# Altium footprint library CONN_B2B.PcbLib: 27 footprints (part 2 of 3)
Each footprint in its own frame and in the unit in brackets; x right, y up, seen from the top. Pads: shape width x height; smd on the part's side, far side on the other; paste and mask are expansions set on the pad; w line width, h text height; cw(c..) or ccw(c..) is an arc to the next point about the centre after c.
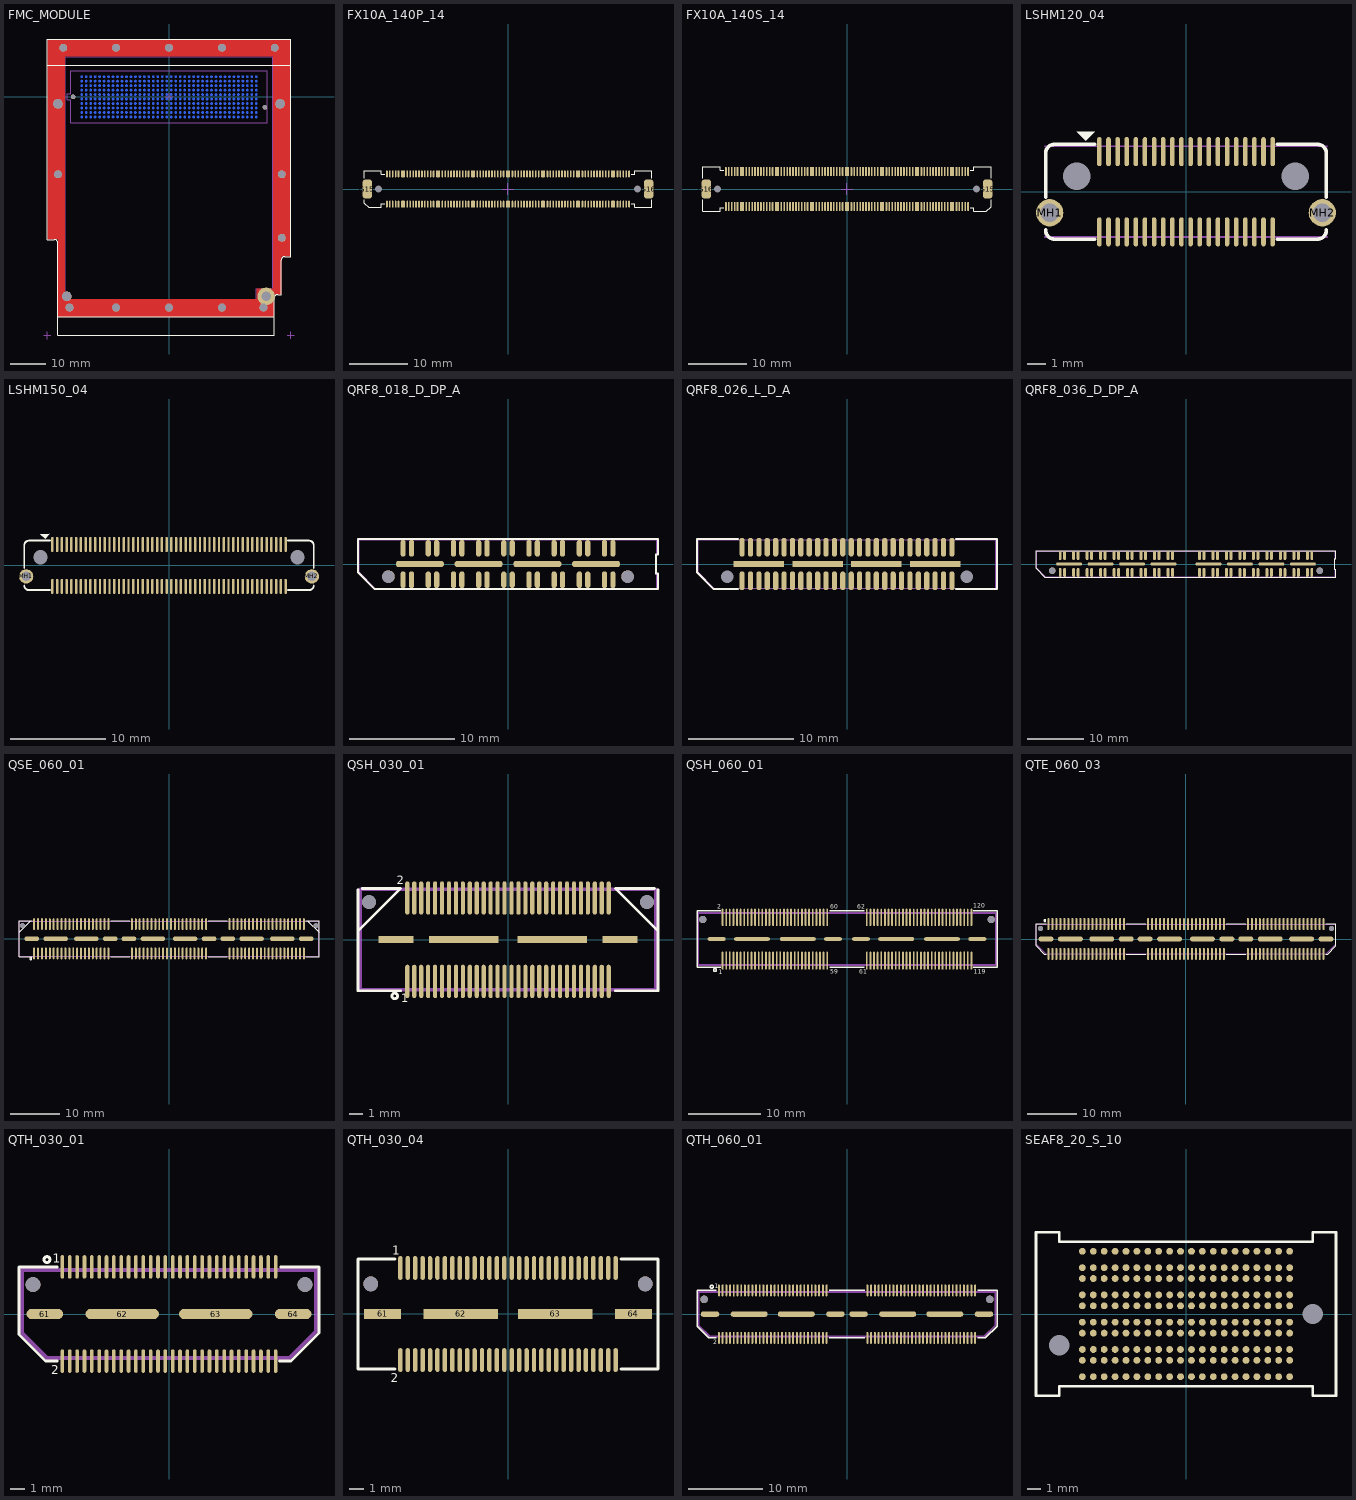
[diagram p1: the footprints below, top view; thin cyan lines are the x and y axes]

## FMC_MODULE [mm] "ASP-134488"
height 1.2
pads (419):
  round 0.65 smd far side: A1(-24.765,5.715) A2(-23.495,5.715) A3(-22.225,5.715) A4(-20.955,5.715) A5(-19.685,5.715) A6(-18.415,5.715) A7(-17.145,5.715) A8(-15.875,5.715) A9(-14.605,5.715) A10(-13.335,5.715) A11(-12.065,5.715) A12(-10.795,5.715) A13(-9.525,5.715) A14(-8.255,5.715) A15(-6.985,5.715) A16(-5.715,5.715) A17(-4.445,5.715) A18(-3.175,5.715) A19(-1.905,5.715) A20(-0.635,5.715) A21(0.635,5.715) A22(1.905,5.715) A23(3.175,5.715) A24(4.445,5.715) A25(5.715,5.715) A26(6.985,5.715) A27(8.255,5.715) A28(9.525,5.715) A29(10.795,5.715) A30(12.065,5.715) A31(13.335,5.715) A32(14.605,5.715) A33(15.875,5.715) A34(17.145,5.715) A35(18.415,5.715) A36(19.685,5.715) A37(20.955,5.715) A38(22.225,5.715) A39(23.495,5.715) A40(24.765,5.715) B1(-24.765,4.445) B2(-23.495,4.445) B3(-22.225,4.445) B4(-20.955,4.445) B5(-19.685,4.445) B6(-18.415,4.445) B7(-17.145,4.445) B8(-15.875,4.445) B9(-14.605,4.445) B10(-13.335,4.445) B11(-12.065,4.445) B12(-10.795,4.445) B13(-9.525,4.445) B14(-8.255,4.445) B15(-6.985,4.445) B16(-5.715,4.445) B17(-4.445,4.445) B18(-3.175,4.445) B19(-1.905,4.445) B20(-0.635,4.445) B21(0.635,4.445) B22(1.905,4.445) B23(3.175,4.445) B24(4.445,4.445) B25(5.715,4.445) B26(6.985,4.445) B27(8.255,4.445) B28(9.525,4.445) B29(10.795,4.445) B30(12.065,4.445) B31(13.335,4.445) B32(14.605,4.445) B33(15.875,4.445) B34(17.145,4.445) B35(18.415,4.445) B36(19.685,4.445) B37(20.955,4.445) B38(22.225,4.445) B39(23.495,4.445) B40(24.765,4.445) C1(-24.765,3.175) C2(-23.495,3.175) C3(-22.225,3.175) C4(-20.955,3.175) C5(-19.685,3.175) C6(-18.415,3.175) C7(-17.145,3.175) C8(-15.875,3.175) C9(-14.605,3.175) C10(-13.335,3.175) C11(-12.065,3.175) C12(-10.795,3.175) C13(-9.525,3.175) C14(-8.255,3.175) C15(-6.985,3.175) C16(-5.715,3.175) C17(-4.445,3.175) C18(-3.175,3.175) C19(-1.905,3.175) C20(-0.635,3.175) C21(0.635,3.175) C22(1.905,3.175) C23(3.175,3.175) C24(4.445,3.175) C25(5.715,3.175) C26(6.985,3.175) C27(8.255,3.175) C28(9.525,3.175) C29(10.795,3.175) C30(12.065,3.175) C31(13.335,3.175) C32(14.605,3.175) C33(15.875,3.175) C34(17.145,3.175) C35(18.415,3.175) C36(19.685,3.175) C37(20.955,3.175) C38(22.225,3.175) C39(23.495,3.175) C40(24.765,3.175) D1(-24.765,1.905) D2(-23.495,1.905) D3(-22.225,1.905) D4(-20.955,1.905) D5(-19.685,1.905) D6(-18.415,1.905) D7(-17.145,1.905) D8(-15.875,1.905) D9(-14.605,1.905) D10(-13.335,1.905) D11(-12.065,1.905) D12(-10.795,1.905) D13(-9.525,1.905) D14(-8.255,1.905) D15(-6.985,1.905) D16(-5.715,1.905) D17(-4.445,1.905) D18(-3.175,1.905) D19(-1.905,1.905) D20(-0.635,1.905) D21(0.635,1.905) D22(1.905,1.905) D23(3.175,1.905) D24(4.445,1.905) D25(5.715,1.905) D26(6.985,1.905) D27(8.255,1.905) D28(9.525,1.905) D29(10.795,1.905) D30(12.065,1.905) D31(13.335,1.905) D32(14.605,1.905) D33(15.875,1.905) D34(17.145,1.905) D35(18.415,1.905) D36(19.685,1.905) D37(20.955,1.905) D38(22.225,1.905) D39(23.495,1.905) D40(24.765,1.905) E1(-24.765,0.635) E2(-23.495,0.635) E3(-22.225,0.635) E4(-20.955,0.635) E5(-19.685,0.635) E6(-18.415,0.635) E7(-17.145,0.635) E8(-15.875,0.635) E9(-14.605,0.635) E10(-13.335,0.635) E11(-12.065,0.635) E12(-10.795,0.635) E13(-9.525,0.635) E14(-8.255,0.635) E15(-6.985,0.635) E16(-5.715,0.635) E17(-4.445,0.635) E18(-3.175,0.635) E19(-1.905,0.635) E20(-0.635,0.635) E21(0.635,0.635) E22(1.905,0.635) E23(3.175,0.635) E24(4.445,0.635) E25(5.715,0.635) E26(6.985,0.635) E27(8.255,0.635) E28(9.525,0.635) E29(10.795,0.635) E30(12.065,0.635) E31(13.335,0.635) E32(14.605,0.635) E33(15.875,0.635) E34(17.145,0.635) E35(18.415,0.635) E36(19.685,0.635) E37(20.955,0.635) E38(22.225,0.635) E39(23.495,0.635) E40(24.765,0.635) F1(-24.765,-0.635) F2(-23.495,-0.635) F3(-22.225,-0.635) F4(-20.955,-0.635) F5(-19.685,-0.635) F6(-18.415,-0.635) F7(-17.145,-0.635) F8(-15.875,-0.635) F9(-14.605,-0.635) F10(-13.335,-0.635) F11(-12.065,-0.635) F12(-10.795,-0.635) F13(-9.525,-0.635) F14(-8.255,-0.635) F15(-6.985,-0.635) F16(-5.715,-0.635) F17(-4.445,-0.635) F18(-3.175,-0.635) F19(-1.905,-0.635) F20(-0.635,-0.635) F21(0.635,-0.635) F22(1.905,-0.635) F23(3.175,-0.635) F24(4.445,-0.635) F25(5.715,-0.635) F26(6.985,-0.635) F27(8.255,-0.635) F28(9.525,-0.635) F29(10.795,-0.635) F30(12.065,-0.635) F31(13.335,-0.635) F32(14.605,-0.635) F33(15.875,-0.635) F34(17.145,-0.635) F35(18.415,-0.635) F36(19.685,-0.635) F37(20.955,-0.635) F38(22.225,-0.635) F39(23.495,-0.635) F40(24.765,-0.635) G1(-24.765,-1.905) G2(-23.495,-1.905) G3(-22.225,-1.905) G4(-20.955,-1.905) G5(-19.685,-1.905) G6(-18.415,-1.905) G7(-17.145,-1.905) G8(-15.875,-1.905) G9(-14.605,-1.905) G10(-13.335,-1.905) G11(-12.065,-1.905) G12(-10.795,-1.905) G13(-9.525,-1.905) G14(-8.255,-1.905) G15(-6.985,-1.905) G16(-5.715,-1.905) G17(-4.445,-1.905) G18(-3.175,-1.905) G19(-1.905,-1.905) G20(-0.635,-1.905) G21(0.635,-1.905) G22(1.905,-1.905) G23(3.175,-1.905) G24(4.445,-1.905) G25(5.715,-1.905) G26(6.985,-1.905) G27(8.255,-1.905) G28(9.525,-1.905) G29(10.795,-1.905) G30(12.065,-1.905) G31(13.335,-1.905) G32(14.605,-1.905) G33(15.875,-1.905) G34(17.145,-1.905) G35(18.415,-1.905) G36(19.685,-1.905) G37(20.955,-1.905) G38(22.225,-1.905) G39(23.495,-1.905) G40(24.765,-1.905) H1(-24.765,-3.175) H2(-23.495,-3.175) H3(-22.225,-3.175) H4(-20.955,-3.175) H5(-19.685,-3.175) H6(-18.415,-3.175) H7(-17.145,-3.175) H8(-15.875,-3.175) H9(-14.605,-3.175) H10(-13.335,-3.175) H11(-12.065,-3.175) H12(-10.795,-3.175) H13(-9.525,-3.175) H14(-8.255,-3.175) H15(-6.985,-3.175) H16(-5.715,-3.175) H17(-4.445,-3.175) H18(-3.175,-3.175) H19(-1.905,-3.175) H20(-0.635,-3.175) H21(0.635,-3.175) H22(1.905,-3.175) H23(3.175,-3.175) H24(4.445,-3.175) H25(5.715,-3.175) H26(6.985,-3.175) H27(8.255,-3.175) H28(9.525,-3.175) H29(10.795,-3.175) H30(12.065,-3.175) H31(13.335,-3.175) H32(14.605,-3.175) H33(15.875,-3.175) H34(17.145,-3.175) H35(18.415,-3.175) H36(19.685,-3.175) H37(20.955,-3.175) H38(22.225,-3.175) H39(23.495,-3.175) H40(24.765,-3.175) J1(-24.765,-4.445) J2(-23.495,-4.445) J3(-22.225,-4.445) J4(-20.955,-4.445) J5(-19.685,-4.445) J6(-18.415,-4.445) J7(-17.145,-4.445) J8(-15.875,-4.445) J9(-14.605,-4.445) J10(-13.335,-4.445) J11(-12.065,-4.445) J12(-10.795,-4.445) J13(-9.525,-4.445) J14(-8.255,-4.445) J15(-6.985,-4.445) J16(-5.715,-4.445) J17(-4.445,-4.445) J18(-3.175,-4.445) J19(-1.905,-4.445) J20(-0.635,-4.445) J21(0.635,-4.445) J22(1.905,-4.445) J23(3.175,-4.445) J24(4.445,-4.445) J25(5.715,-4.445) J26(6.985,-4.445) J27(8.255,-4.445) J28(9.525,-4.445) J29(10.795,-4.445) J30(12.065,-4.445) J31(13.335,-4.445) J32(14.605,-4.445) J33(15.875,-4.445) J34(17.145,-4.445) J35(18.415,-4.445) J36(19.685,-4.445) J37(20.955,-4.445) J38(22.225,-4.445) J39(23.495,-4.445) J40(24.765,-4.445) K1(-24.765,-5.715) K2(-23.495,-5.715) K3(-22.225,-5.715) K4(-20.955,-5.715) K5(-19.685,-5.715) K6(-18.415,-5.715) K7(-17.145,-5.715) K8(-15.875,-5.715) K9(-14.605,-5.715) K10(-13.335,-5.715) K11(-12.065,-5.715) K12(-10.795,-5.715) K13(-9.525,-5.715) K14(-8.255,-5.715) K15(-6.985,-5.715) K16(-5.715,-5.715) K17(-4.445,-5.715) K18(-3.175,-5.715) K19(-1.905,-5.715) K20(-0.635,-5.715) K21(0.635,-5.715) K22(1.905,-5.715) K23(3.175,-5.715) K24(4.445,-5.715) K25(5.715,-5.715) K26(6.985,-5.715) K27(8.255,-5.715) K28(9.525,-5.715) K29(10.795,-5.715) K30(12.065,-5.715) K31(13.335,-5.715) K32(14.605,-5.715) K33(15.875,-5.715) K34(17.145,-5.715) K35(18.415,-5.715) K36(19.685,-5.715) K37(20.955,-5.715) K38(22.225,-5.715) K39(23.495,-5.715) K40(24.765,-5.715)
  round 2.2 hole 2.2: ""(-31.5,-22) ""(-30,13.9) ""(-28.2,-59.8) ""(-15,-59.8) ""(-15,13.9) ""(0,-59.8) ""(0,13.9) ""(15,-59.8) ""(15,13.9) ""(26.8,-59.8) ""(30,13.9) ""(32,-40) ""(32,-22)
  round 2.7 hole 2.7: ""(-31.5,-2) ""(-29,-56.6) ""(31.5,-2)
  round 1.3 hole 1.3 unplated: ""(-27.2,0) ""(27.2,-3)
  round 5 hole 2.7: ""(27.55,-56.6)
Top Layer:
  rectangle: -34.5,11.4 34.5,16.4
  rectangle: -34.5,-40.5 -29.5,16.4
  rectangle: -31.5,-62.4 -29.5,-40.5
  rectangle: -31.5,-62.4 29.8,-57.4
  rectangle: 24.8,-62.4 29.8,-54.4
  rectangle: 29.5,-56.1 31.9,-45.3
  rectangle: 29.5,-45.3 34.5,16.4
Top Overlay:
  lines w0.2: -31.5,-62.4 29.8,-62.4 ; -34.5,8.9 -34.5,-40.5 -32.5,-40.5 cw(c-32.5,-41.5) -31.5,-41.5 -31.5,-67.7 29.8,-67.7 29.8,-57.1 cw(c30.8,-57.1) 30.8,-56.1 31.9,-56.1 31.9,-46.3 cw(c32.9,-46.3) 32.9,-45.3 34.5,-45.3 34.5,8.9 ; -34.5,8.9 34.5,8.9 ; -34.5,8.9 -34.5,16.4 34.5,16.4 34.5,8.9
Bottom Overlay:
  lines w0.2: -29,-6.7 -34,-6.7 -34,16.2 34,16.2 34,-6.7 29,-6.7 ; -28.9,-0.9 -28.9,0.9 -28,0.9 -28,7.5 28,7.5 28,-7.5 -28,-7.5 -28,-0.9 -28.9,-0.9
  text "K" at 29.3,-6.2 h0.8
  text "J" at 29.3,-5 h0.8
  text "E" at 29.3,0.2 h0.8
  text "D" at 29.3,1.5 h0.8
  text "C" at 29.3,2.7 h0.8
  text "B" at 29.3,3.9 h0.8
  text "A" at 29.3,5.2 h0.8
  text "40" at 25.3,8 h0.8
  text "1" at -24.6,8 h0.8
Mechanical 1:
  lines w0.2: -35.5,-67.7 -33.5,-67.7 ; -34.5,-68.7 -34.5,-66.7 ; -1,0 1,0 ; 0,-1 0,1 ; 24.8,-57.4 -29.5,-57.4 -29.5,11.4 29.5,11.4 29.5,-54.4 24.8,-54.4 24.8,-57.3 ; 33.5,-67.7 35.5,-67.7 ; 34.5,-68.7 34.5,-66.7
Mechanical 13:
  lines w0.2: -28.8,-0.8 -27.9,-0.8 -27.9,-7.4 27.9,-7.4 27.9,7.4 -27.9,7.4 -27.9,0.8 -28.8,0.8 -28.8,-0.8
3D body "SEAM-40-02.0-L-10-1-A-K-TR.stp": height 5.66, standoff -1.22, extent -28.778,-7.341 27.889,7.341

## FX10A_140P_14 [mm] "FX10A-140P/14-SV(71) HIROSE"
height 4
pads (158):
  oval 0.3x1.2 smd mask+0.075: 1(-20.75,-2.6) 2(-20.75,2.6) 3(-20.25,-2.6) 4(-20.25,2.6) 5(-19.75,-2.6) 6(-19.75,2.6) 7(-19.25,-2.6) 8(-19.25,2.6) 9(-18.75,-2.6) 10(-18.75,2.6) 11(-17.25,-2.6) 12(-17.25,2.6) 13(-16.75,-2.6) 14(-16.75,2.6) 15(-16.25,-2.6) 16(-16.25,2.6) 17(-15.75,-2.6) 18(-15.75,2.6) 19(-15.25,-2.6) 20(-15.25,2.6) 21(-14.75,-2.6) 22(-14.75,2.6) 23(-14.25,-2.6) 24(-14.25,2.6) 25(-13.75,-2.6) 26(-13.75,2.6) 27(-13.25,-2.6) 28(-13.25,2.6) 29(-12.75,-2.6) 30(-12.75,2.6) 31(-11.25,-2.6) 32(-11.25,2.6) 33(-10.75,-2.6) 34(-10.75,2.6) 35(-10.25,-2.6) 36(-10.25,2.6) 37(-9.75,-2.6) 38(-9.75,2.6) 39(-9.25,-2.6) 40(-9.25,2.6) 41(-8.75,-2.6) 42(-8.75,2.6) 43(-8.25,-2.6) 44(-8.25,2.6) 45(-7.75,-2.6) 46(-7.75,2.6) 47(-7.25,-2.6) 48(-7.25,2.6) 49(-6.75,-2.6) 50(-6.75,2.6) 51(-5.25,-2.6) 52(-5.25,2.6) 53(-4.75,-2.6) 54(-4.75,2.6) 55(-4.25,-2.6) 56(-4.25,2.6) 57(-3.75,-2.6) 58(-3.75,2.6) 59(-3.25,-2.6) 60(-3.25,2.6) 61(-2.75,-2.6) 62(-2.75,2.6) 63(-2.25,-2.6) 64(-2.25,2.6) 65(-1.75,-2.6) 66(-1.75,2.6) 67(-1.25,-2.6) 68(-1.25,2.6) 69(-0.75,-2.6) 70(-0.75,2.6) 71(0.75,-2.6) 72(0.75,2.6) 73(1.25,-2.6) 74(1.25,2.6) 75(1.75,-2.6) 76(1.75,2.6) 77(2.25,-2.6) 78(2.25,2.6) 79(2.75,-2.6) 80(2.75,2.6) 81(3.25,-2.6) 82(3.25,2.6) 83(3.75,-2.6) 84(3.75,2.6) 85(4.25,-2.6) 86(4.25,2.6) 87(4.75,-2.6) 88(4.75,2.6) 89(5.25,-2.6) 90(5.25,2.6) 91(6.75,-2.6) 92(6.75,2.6) 93(7.25,-2.6) 94(7.25,2.6) 95(7.75,-2.6) 96(7.75,2.6) 97(8.25,-2.6) 98(8.25,2.6) 99(8.75,-2.6) 100(8.75,2.6) 101(9.25,-2.6) 102(9.25,2.6) 103(9.75,-2.6) 104(9.75,2.6) 105(10.25,-2.6) 106(10.25,2.6) 107(10.75,-2.6) 108(10.75,2.6) 109(11.25,-2.6) 110(11.25,2.6) 111(12.75,-2.6) 112(12.75,2.6) 113(13.25,-2.6) 114(13.25,2.6) 115(13.75,-2.6) 116(13.75,2.6) 117(14.25,-2.6) 118(14.25,2.6) 119(14.75,-2.6) 120(14.75,2.6) 121(15.25,-2.6) 122(15.25,2.6) 123(15.75,-2.6) 124(15.75,2.6) 125(16.25,-2.6) 126(16.25,2.6) 127(16.75,-2.6) 128(16.75,2.6) 129(17.25,-2.6) 130(17.25,2.6) 131(18.75,-2.6) 132(18.75,2.6) 133(19.25,-2.6) 134(19.25,2.6) 135(19.75,-2.6) 136(19.75,2.6) 137(20.25,-2.6) 138(20.25,2.6) 139(20.75,-2.6) 140(20.75,2.6)
  rrect50% 0.7x1.2 smd mask+0.075: G1(-18,-2.6) G2(-18,2.6) G3(-12,-2.6) G4(-12,2.6) G5(-6,-2.6) G6(-6,2.6) G7(0,-2.6) G8(0,2.6) G9(6,-2.6) G10(6,2.6) G11(12,-2.6) G12(12,2.6) G13(18,-2.6) G14(18,2.6)
  rrect50% 1.6x3.2 smd mask+0.075: G15(-24.1,0) G16(24.1,0)
  round 0.5 hole 1.2 unplated: ""(-22.2,0) ""(22.2,0)
Top Overlay:
  lines w0.2: -24.6,-1.8 -24.6,-2.4 -23.9,-3.1 -21.7,-3.1 -21.7,-2.5 -21.1,-2.5 ; -24.6,1.8 -24.6,3.1 -21.7,3.1 -21.7,2.5 -21.1,2.5 ; 21.1,-2.5 21.7,-2.5 21.7,-3.1 24.6,-3.1 24.6,-1.8 ; 21.1,2.5 21.7,2.5 21.7,3.1 24.6,3.1 24.6,1.8
Mechanical 13:
  lines w0.1: -1,0 1,0 ; 0,-1 0,1
3D body "FX10A-140P14-SV.stp": height 3.51, standoff -0.59, extent -24.55,-2.95 24.55,2.95

## FX10A_140S_14 [mm] "FX10A-140S/14-SV HIROSE"
height 4
pads (158):
  oval 0.3x1.6 smd mask+0.075: 1(20.75,-3) 2(20.75,3) 3(20.25,-3) 4(20.25,3) 5(19.75,-3) 6(19.75,3) 7(19.25,-3) 8(19.25,3) 9(18.75,-3) 10(18.75,3) 11(17.25,-3) 12(17.25,3) 13(16.75,-3) 14(16.75,3) 15(16.25,-3) 16(16.25,3) 17(15.75,-3) 18(15.75,3) 19(15.25,-3) 20(15.25,3) 21(14.75,-3) 22(14.75,3) 23(14.25,-3) 24(14.25,3) 25(13.75,-3) 26(13.75,3) 27(13.25,-3) 28(13.25,3) 29(12.75,-3) 30(12.75,3) 31(11.25,-3) 32(11.25,3) 33(10.75,-3) 34(10.75,3) 35(10.25,-3) 36(10.25,3) 37(9.75,-3) 38(9.75,3) 39(9.25,-3) 40(9.25,3) 41(8.75,-3) 42(8.75,3) 43(8.25,-3) 44(8.25,3) 45(7.75,-3) 46(7.75,3) 47(7.25,-3) 48(7.25,3) 49(6.75,-3) 50(6.75,3) 51(5.25,-3) 52(5.25,3) 53(4.75,-3) 54(4.75,3) 55(4.25,-3) 56(4.25,3) 57(3.75,-3) 58(3.75,3) 59(3.25,-3) 60(3.25,3) 61(2.75,-3) 62(2.75,3) 63(2.25,-3) 64(2.25,3) 65(1.75,-3) 66(1.75,3) 67(1.25,-3) 68(1.25,3) 69(0.75,-3) 70(0.75,3) 71(-0.75,-3) 72(-0.75,3) 73(-1.25,-3) 74(-1.25,3) 75(-1.75,-3) 76(-1.75,3) 77(-2.25,-3) 78(-2.25,3) 79(-2.75,-3) 80(-2.75,3) 81(-3.25,-3) 82(-3.25,3) 83(-3.75,-3) 84(-3.75,3) 85(-4.25,-3) 86(-4.25,3) 87(-4.75,-3) 88(-4.75,3) 89(-5.25,-3) 90(-5.25,3) 91(-6.75,-3) 92(-6.75,3) 93(-7.25,-3) 94(-7.25,3) 95(-7.75,-3) 96(-7.75,3) 97(-8.25,-3) 98(-8.25,3) 99(-8.75,-3) 100(-8.75,3) 101(-9.25,-3) 102(-9.25,3) 103(-9.75,-3) 104(-9.75,3) 105(-10.25,-3) 106(-10.25,3) 107(-10.75,-3) 108(-10.75,3) 109(-11.25,-3) 110(-11.25,3) 111(-12.75,-3) 112(-12.75,3) 113(-13.25,-3) 114(-13.25,3) 115(-13.75,-3) 116(-13.75,3) 117(-14.25,-3) 118(-14.25,3) 119(-14.75,-3) 120(-14.75,3) 121(-15.25,-3) 122(-15.25,3) 123(-15.75,-3) 124(-15.75,3) 125(-16.25,-3) 126(-16.25,3) 127(-16.75,-3) 128(-16.75,3) 129(-17.25,-3) 130(-17.25,3) 131(-18.75,-3) 132(-18.75,3) 133(-19.25,-3) 134(-19.25,3) 135(-19.75,-3) 136(-19.75,3) 137(-20.25,-3) 138(-20.25,3) 139(-20.75,-3) 140(-20.75,3)
  rrect50% 0.7x1.6 smd mask+0.075: G1(18,-3) G2(18,3) G3(12,-3) G4(12,3) G5(6,-3) G6(6,3) G7(0,-3) G8(0,3) G9(-6,-3) G10(-6,3) G11(-12,-3) G12(-12,3) G13(-18,-3) G14(-18,3)
  rrect50% 1.6x3.2 smd mask+0.075: G15(24.1,0) G16(-24.1,0)
  round 0.5 hole 1.2 unplated: ""(-22.2,0) ""(22.2,0)
Top Overlay:
  lines w0.2: -24.7,-1.8 -24.7,-3.8 -21.7,-3.8 -21.7,-3.2 -21.1,-3.2 ; -24.7,1.8 -24.7,3.8 -21.7,3.8 -21.7,3.2 -21.1,3.2 ; 21.1,-3.2 21.7,-3.2 21.7,-3.8 23.9,-3.8 24.7,-3 24.7,-1.8 ; 21.1,3.2 21.7,3.2 21.7,3.8 24.7,3.8 24.7,1.8
Mechanical 13:
  lines w0.1: -1,0 1,0 ; 0,-1 0,1
3D body "FX10A-140S14-SV.stp": height 3.22, standoff -0.58, extent -24.55,-3.65 24.55,3.65

## LSHM120_04 [mm] "LSHM-120-04.0-L-DV-A-S"
pads (44):
  oval 0.25x1.6 smd mask+0.05: 1(-4.75,2.2) 2(-4.75,-2.2) 3(-4.25,2.2) 4(-4.25,-2.2) 5(-3.75,2.2) 6(-3.75,-2.2) 7(-3.25,2.2) 8(-3.25,-2.2) 9(-2.75,2.2) 10(-2.75,-2.2) 11(-2.25,2.2) 12(-2.25,-2.2) 13(-1.75,2.2) 14(-1.75,-2.2) 15(-1.25,2.2) 16(-1.25,-2.2) 17(-0.75,2.2) 18(-0.75,-2.2) 19(-0.25,2.2) 20(-0.25,-2.2) 21(0.25,2.2) 22(0.25,-2.2) 23(0.75,2.2) 24(0.75,-2.2) 25(1.25,2.2) 26(1.25,-2.2) 27(1.75,2.2) 28(1.75,-2.2) 29(2.25,2.2) 30(2.25,-2.2) 31(2.75,2.2) 32(2.75,-2.2) 33(3.25,2.2) 34(3.25,-2.2) 35(3.75,2.2) 36(3.75,-2.2) 37(4.25,2.2) 38(4.25,-2.2) 39(4.75,2.2) 40(4.75,-2.2)
  round 1.5 hole 1 mask+0.075: MH1(-7.475,-1.15) MH2(7.475,-1.15)
  round 0 hole 1.5 unplated mask+0.1: ""(-6,0.85) ""(6,0.85)
Top Overlay:
  region: -5.507,2.807 -5.014,3.3 -6,3.3
  lines w0.2: -7.7,-2.1 ccw(c-7.2,-2.1) -7.2,-2.6 -5,-2.6 ; -7.7,-0.3 -7.7,2.1 cw(c-7.2,2.1) -7.2,2.6 -5,2.6 ; 5,-2.6 7.2,-2.6 ccw(c7.2,-2.1) 7.7,-2.1 ; 5,2.6 7.2,2.6 cw(c7.2,2.1) 7.7,2.1 7.7,-0.3
Mechanical 13:
  lines w0.1: -7.725,-2.49 7.725,-2.49 ; -7.725,2.49 7.725,2.49
3D body "LSHM-120-04.0-L-DV-A-S-K-TR.stp": height 5.6, standoff -1.65, extent -7.899,-2.49 7.899,2.49

## LSHM150_04 [mm] "LSHM-150-04.0-L-DV-A-S"
pads (104):
  oval 0.25x1.6 smd mask+0.075: 1(-12.25,2.2) 2(-12.25,-2.2) 3(-11.75,2.2) 4(-11.75,-2.2) 5(-11.25,2.2) 6(-11.25,-2.2) 7(-10.75,2.2) 8(-10.75,-2.2) 9(-10.25,2.2) 10(-10.25,-2.2) 11(-9.75,2.2) 12(-9.75,-2.2) 13(-9.25,2.2) 14(-9.25,-2.2) 15(-8.75,2.2) 16(-8.75,-2.2) 17(-8.25,2.2) 18(-8.25,-2.2) 19(-7.75,2.2) 20(-7.75,-2.2) 21(-7.25,2.2) 22(-7.25,-2.2) 23(-6.75,2.2) 24(-6.75,-2.2) 25(-6.25,2.2) 26(-6.25,-2.2) 27(-5.75,2.2) 28(-5.75,-2.2) 29(-5.25,2.2) 30(-5.25,-2.2) 31(-4.75,2.2) 32(-4.75,-2.2) 33(-4.25,2.2) 34(-4.25,-2.2) 35(-3.75,2.2) 36(-3.75,-2.2) 37(-3.25,2.2) 38(-3.25,-2.2) 39(-2.75,2.2) 40(-2.75,-2.2) 41(-2.25,2.2) 42(-2.25,-2.2) 43(-1.75,2.2) 44(-1.75,-2.2) 45(-1.25,2.2) 46(-1.25,-2.2) 47(-0.75,2.2) 48(-0.75,-2.2) 49(-0.25,2.2) 50(-0.25,-2.2) 51(0.25,2.2) 52(0.25,-2.2) 53(0.75,2.2) 54(0.75,-2.2) 55(1.25,2.2) 56(1.25,-2.2) 57(1.75,2.2) 58(1.75,-2.2) 59(2.25,2.2) 60(2.25,-2.2) 61(2.75,2.2) 62(2.75,-2.2) 63(3.25,2.2) 64(3.25,-2.2) 65(3.75,2.2) 66(3.75,-2.2) 67(4.25,2.2) 68(4.25,-2.2) 69(4.75,2.2) 70(4.75,-2.2) 71(5.25,2.2) 72(5.25,-2.2) 73(5.75,2.2) 74(5.75,-2.2) 75(6.25,2.2) 76(6.25,-2.2) 77(6.75,2.2) 78(6.75,-2.2) 79(7.25,2.2) 80(7.25,-2.2) 81(7.75,2.2) 82(7.75,-2.2) 83(8.25,2.2) 84(8.25,-2.2) 85(8.75,2.2) 86(8.75,-2.2) 87(9.25,2.2) 88(9.25,-2.2) 89(9.75,2.2) 90(9.75,-2.2) 91(10.25,2.2) 92(10.25,-2.2) 93(10.75,2.2) 94(10.75,-2.2) 95(11.25,2.2) 96(11.25,-2.2) 97(11.75,2.2) 98(11.75,-2.2) 99(12.25,2.2) 100(12.25,-2.2)
  round 1.5 hole 1: MH1(-15,-1.15) MH2(15,-1.15)
  round 0 hole 1.5 unplated mask+0.1: ""(-13.5,0.85) ""(13.5,0.85)
Top Overlay:
  region: -13.007,2.807 -12.514,3.3 -13.5,3.3
  lines w0.2: -15.2,-2.1 ccw(c-14.7,-2.1) -14.7,-2.6 -12.5,-2.6 ; -15.2,-0.3 -15.2,2.1 cw(c-14.7,2.1) -14.7,2.6 -12.5,2.6 ; 12.5,-2.6 14.7,-2.6 ccw(c14.7,-2.1) 15.2,-2.1 ; 12.5,2.6 14.7,2.6 cw(c14.7,2.1) 15.2,2.1 15.2,-0.3
3D body "LSHM-150-04.0-L-DV-A-S-TR.stp": height 5.45, standoff -1.65, extent -15.399,-2.49 15.399,2.49
